# Altium schematic symbol library 13-Analog D 数模模数.SchLib: 573 symbols (part 1 of 6)
Pins are listed as number, name and electrical type; pins without a type are passive.

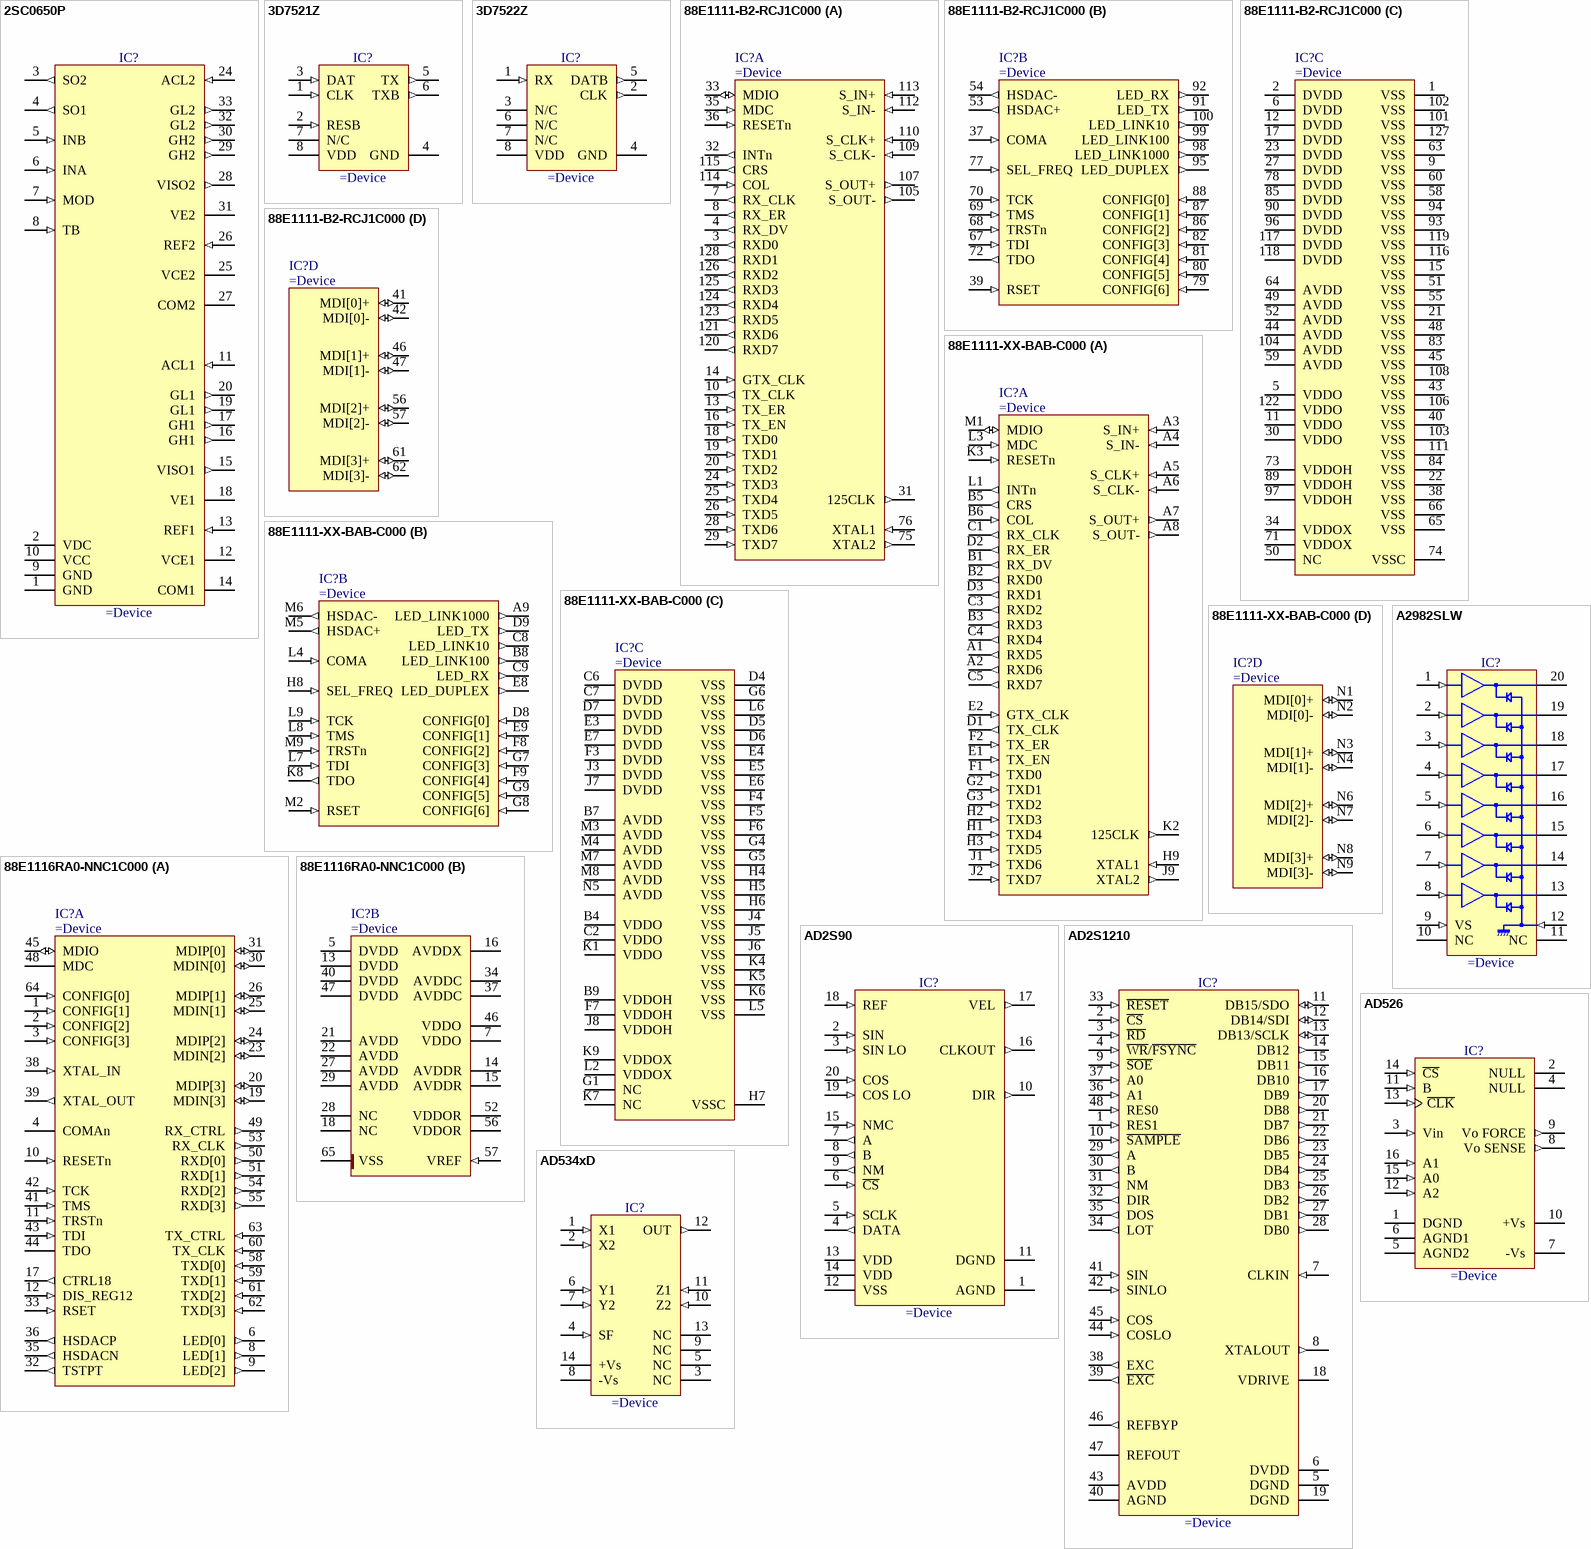
[diagram p0: symbols 2SC0650P to AD534xD]

## 2SC0650P
designator IC?
Dual-Channel High-Power High-Frequency SCALE-2 Driver Core
pins: 1 GND (power), 2 VDC (power), 3 SO2 (out), 4 SO1 (out), 5 INB (in), 6 INA (in), 7 MOD (in), 8 TB (in), 9 GND (power), 10 VCC (power), 11 ACL1 (in), 12 VCE1 (oc), 13 REF1 (in), 14 COM1 (power), 15 VISO1 (out), 16 GH1 (out), 17 GH1 (out), 18 VE1 (oe), 19 GL1 (out), 20 GL1 (out), 24 ACL2 (in), 25 VCE2 (oc), 26 REF2 (in), 27 COM2 (power), 28 VISO2 (out), 29 GH2 (out), 30 GH2 (out), 31 VE2 (oe), 32 GL2 (out), 33 GL2 (out)

## 3D7521Z
designator IC?
Monolithic Manchester Encoder
pins: 1 CLK (in), 2 RESB (in), 3 DAT (in), 4 GND (power), 5 TX (out), 6 TXB (out), 7 N/C, 8 VDD (power)

## 3D7522Z
designator IC?
Monolithic CMOS Manchester Decoders
pins: 1 RX (in), 2 CLK (out), 3 N/C, 4 GND (power), 5 DATB (out), 6 N/C, 7 N/C, 8 VDD (power)

## 88E1111-B2-RCJ1C000
designator IC?
Integrated 10/100/1000 Ultra Gigabit Ethernet Transceiver
part A pins: 3 RXD0 (out), 4 RX_DV (out), 7 RX_CLK (out), 8 RX_ER (out), 10 TX_CLK (out), 13 TX_ER (in), 14 GTX_CLK (in), 16 TX_EN (in), 18 TXD0 (in), 19 TXD1 (in), 20 TXD2 (in), 24 TXD3 (in), 25 TXD4 (in), 26 TXD5 (in), 28 TXD6 (in), 29 TXD7 (in), 31 125CLK (out), 32 INTn (out), 33 MDIO (io), 35 MDC (in), 36 RESETn (in), 75 XTAL2 (out), 76 XTAL1 (in), 105 S_OUT- (out), 107 S_OUT+ (out), 109 S_CLK- (in), 110 S_CLK+ (in), 112 S_IN- (in), 113 S_IN+ (in), 114 COL (in), 115 CRS (out), 120 RXD7 (out), 121 RXD6 (out), 123 RXD5 (out), 124 RXD4 (out), 125 RXD3 (out), 126 RXD2 (out), 128 RXD1 (out)
part B pins: 37 COMA (in), 39 RSET (in), 53 HSDAC+ (out), 54 HSDAC- (out), 67 TDI (in), 68 TRSTn (in), 69 TMS (in), 70 TCK (in), 72 TDO (out), 77 SEL_FREQ (in), 79 CONFIG[6] (in), 80 CONFIG[5] (in), 81 CONFIG[4] (in), 82 CONFIG[3] (in), 86 CONFIG[2] (in), 87 CONFIG[1] (in), 88 CONFIG[0] (in), 91 LED_TX (out), 92 LED_RX (out), 95 LED_DUPLEX (out), 98 LED_LINK1000 (out), 99 LED_LINK100 (out), 100 LED_LINK10 (out)
part C pins: 1 VSS (power), 2 DVDD (power), 5 VDDO (power), 6 DVDD (power), 9 VSS (power), 11 VDDO (power), 12 DVDD (power), 15 VSS (power), 17 DVDD (power), 21 VSS (power), 22 VSS (power), 23 DVDD (power), 27 DVDD (power), 30 VDDO (power), 34 VDDOX (power), 38 VSS (power), 40 VSS (power), 43 VSS (power), 44 AVDD (power), 45 VSS (power), 48 VSS (power), 49 AVDD (power), 50 NC, 51 VSS (power), 52 AVDD (power), 55 VSS (power), 58 VSS (power), 59 AVDD (power), 60 VSS (power), 63 VSS (power), 64 AVDD (power), 65 VSS (power), 66 VSS (power), 71 VDDOX (power), 73 VDDOH (power), 74 VSSC (power), 78 DVDD (power), 83 VSS (power), 84 VSS (power), 85 DVDD (power), 89 VDDOH (power), 90 DVDD (power), 93 VSS (power), 94 VSS (power), 96 DVDD (power), 97 VDDOH (power), 101 VSS (power), 102 VSS (power), 103 VSS (power), 104 AVDD (power), 106 VSS (power), 108 VSS (power), 111 VSS (power), 116 VSS (power), 117 DVDD (power), 118 DVDD (power), 119 VSS (power), 122 VDDO (power), 127 VSS (power)
part D pins: 41 MDI[0]+ (io), 42 MDI[0]- (io), 46 MDI[1]+ (io), 47 MDI[1]- (io), 56 MDI[2]+ (io), 57 MDI[2]- (io), 61 MDI[3]+ (io), 62 MDI[3]- (io)

## 88E1111-XX-BAB-C000
designator IC?
Integrated 10/100/1000 Ultra Gigabit Ethernet Transceiver
part A pins: A1 RXD5 (out), A2 RXD6 (out), A3 S_IN+ (in), A4 S_IN- (in), A5 S_CLK+ (in), A6 S_CLK- (in), A7 S_OUT+ (out), A8 S_OUT- (out), B1 RX_DV (out), B2 RXD0 (out), B3 RXD3 (out), B5 CRS (out), B6 COL (in), C1 RX_CLK (out), C3 RXD2 (out), C4 RXD4 (out), C5 RXD7 (out), D1 TX_CLK (out), D2 RX_ER (out), D3 RXD1 (out), E1 TX_EN (in), E2 GTX_CLK (in), F1 TXD0 (in), F2 TX_ER (in), G2 TXD1 (in), G3 TXD2 (in), H1 TXD4 (in), H2 TXD3 (in), H3 TXD5 (in), H9 XTAL1 (in), J1 TXD6 (in), J2 TXD7 (in), J9 XTAL2 (out), K2 125CLK (out), K3 RESETn (in), L1 INTn (out), L3 MDC (in), M1 MDIO (io)
part B pins: A9 LED_LINK1000 (out), B8 LED_LINK100 (out), C8 LED_LINK10 (out), C9 LED_RX (out), D8 CONFIG[0] (in), D9 LED_TX (out), E8 LED_DUPLEX (out), E9 CONFIG[1] (in), F8 CONFIG[2] (in), F9 CONFIG[4] (in), G7 CONFIG[3] (in), G8 CONFIG[6] (in), G9 CONFIG[5] (in), H8 SEL_FREQ (in), K8 TDO (out), L4 COMA (in), L7 TDI (in), L8 TMS (in), L9 TCK (in), M2 RSET (in), M5 HSDAC+ (out), M6 HSDAC- (out), M9 TRSTn (in)
part C pins: B4 VDDO (power), B7 AVDD (power), B9 VDDOH (power), C2 VDDO (power), C6 DVDD (power), C7 DVDD (power), D4 VSS (power), D5 VSS (power), D6 VSS (power), D7 DVDD (power), E3 DVDD (power), E4 VSS (power), E5 VSS (power), E6 VSS (power), E7 DVDD (power), F3 DVDD (power), F4 VSS (power), F5 VSS (power), F6 VSS (power), F7 VDDOH (power), G1 NC, G4 VSS (power), G5 VSS (power), G6 VSS (power), H4 VSS (power), H5 VSS (power), H6 VSS (power), H7 VSSC (power), J3 DVDD (power), J4 VSS (power), J5 VSS (power), J6 VSS (power), J7 DVDD (power), J8 VDDOH (power), K1 VDDO (power), K4 VSS (power), K5 VSS (power), K6 VSS (power), K7 NC, K9 VDDOX (power), L2 VDDOX (power), L5 VSS (power), L6 VSS (power), M3 AVDD (power), M4 AVDD (power), M7 AVDD (power), M8 AVDD (power), N5 AVDD (power)
part D pins: N1 MDI[0]+ (io), N2 MDI[0]- (io), N3 MDI[1]+ (io), N4 MDI[1]- (io), N6 MDI[2]+ (io), N7 MDI[2]- (io), N8 MDI[3]+ (io), N9 MDI[3]- (io)

## 88E1116RA0-NNC1C000
designator IC?
Integrated 10/100/1000 Alaska® Gigabit Ethernet Transceiver
part A pins: 1 CONFIG[1] (in), 2 CONFIG[2] (in), 3 CONFIG[3] (in), 4 COMAn (power), 6 LED[0] (out), 8 LED[1] (out), 9 LED[2] (out), 10 RESETn (in), 11 TRSTn (in), 12 DIS_REG12 (in), 17 CTRL18 (out), 19 MDIN[3] (io), 20 MDIP[3] (io), 23 MDIN[2] (io), 24 MDIP[2] (io), 25 MDIN[1] (io), 26 MDIP[1] (io), 30 MDIN[0] (io), 31 MDIP[0] (io), 32 TSTPT (out), 33 RSET (in), 35 HSDACN (out), 36 HSDACP (out), 38 XTAL_IN (in), 39 XTAL_OUT (out), 41 TMS (in), 42 TCK (in), 43 TDI (in), 44 TDO, 45 MDIO (io), 48 MDC, 49 RX_CTRL (out), 50 RXD[0] (out), 51 RXD[1] (out), 53 RX_CLK (out), 54 RXD[2] (out), 55 RXD[3] (out), 58 TXD[0] (in), 59 TXD[1] (in), 60 TX_CLK (in), 61 TXD[2] (in), 62 TXD[3] (in), 63 TX_CTRL (in), 64 CONFIG[0] (in)
part B pins: 5 DVDD (power), 7 VDDO (power), 13 DVDD (power), 14 AVDDR (power), 15 AVDDR (power), 16 AVDDX (power), 18 NC, 21 AVDD (power), 22 AVDD (power), 27 AVDD (power), 28 NC, 29 AVDD (power), 34 AVDDC (power), 37 AVDDC (power), 40 DVDD (power), 46 VDDO (power), 47 DVDD (power), 52 VDDOR (power), 56 VDDOR (power), 57 VREF (in), 65 VSS (power)

## A2982SLW
designator IC?
8-Channel Source Drivers
pins: 1 I1 (in), 2 I2 (in), 3 I3 (in), 4 I4 (in), 5 I5 (in), 6 I6 (in), 7 I7 (in), 8 I8 (in), 9 VS (in), 10 NC, 11 NC, 12 GND (in), 13 O8 (oc), 14 O7 (oc), 15 O6 (oc), 16 O5 (oc), 17 O4 (oc), 18 O3 (oc), 19 O2 (oc), 20 O1 (oc)

## AD2S90
designator IC?
Low Cost, Complete 12-Bit Resolver-to-Digital Converter
pins: 1 AGND (power), 2 SIN (in), 3 SIN LO (in), 4 DATA (out), 5 SCLK (in), 6 ~{CS} (in), 7 A (out), 8 B (out), 9 NM (out), 10 DIR (out), 11 DGND (power), 12 VSS (power), 13 VDD (power), 14 VDD (power), 15 NMC (in), 16 CLKOUT (out), 17 VEL (out), 18 REF (in), 19 COS LO (in), 20 COS (in)

## AD2S1210
designator IC?
Variable Resolution, 10-Bit to 16-Bit R/D Converter with Reference Oscillator
pins: 1 RES1 (in), 2 ~{CS} (in), 3 ~{RD} (in), 4 ~{WR}/~{FSYNC} (in), 5 DGND (power), 6 DVDD (power), 7 CLKIN (in), 8 XTALOUT (out), 9 ~{SOE} (in), 10 ~{SAMPLE} (in), 11 DB15/SDO (io), 12 DB14/SDI (io), 13 DB13/SCLK (io), 14 DB12 (out), 15 DB11 (out), 16 DB10 (out), 17 DB9 (out), 18 VDRIVE (power), 19 DGND (power), 20 DB8 (out), 21 DB7 (out), 22 DB6 (out), 23 DB5 (out), 24 DB4 (out), 25 DB3 (out), 26 DB2 (out), 27 DB1 (out), 28 DB0 (out), 29 A (out), 30 B (out), 31 NM (out), 32 DIR (out), 33 ~{RESET} (in), 34 LOT (out), 35 DOS (out), 36 A1 (in), 37 A0 (in), 38 EXC (out), 39 ~{EXC} (out), 40 AGND (power), 41 SIN (in), 42 SINLO (in), 43 AVDD (power), 44 COSLO (in), 45 COS (in), 46 REFBYP (out), 47 REFOUT, 48 RES0 (in)

## AD526
designator IC?
Software Programmable Gain Amplifier
pins: 1 DGND (power), 2 NULL, 3 Vin (in), 4 NULL, 5 AGND2 (power), 6 AGND1 (power), 7 -Vs (power), 8 Vo SENSE (out), 9 Vo FORCE (out), 10 +Vs (power), 11 B (in), 12 A2 (in), 13 ~{CLK} (in), 14 ~{CS} (in), 15 A0 (in), 16 A1 (in)

## AD534xD
designator IC?
Monolithic Laser Trimmed Four-Quadrant Multiplier Divider
pins: 1 X1 (in), 2 X2 (in), 3 NC, 4 SF (in), 5 NC, 6 Y1 (in), 7 Y2 (in), 8 -Vs (power), 9 NC, 10 Z2 (in), 11 Z1 (in), 12 OUT (out), 13 NC, 14 +Vs (power)

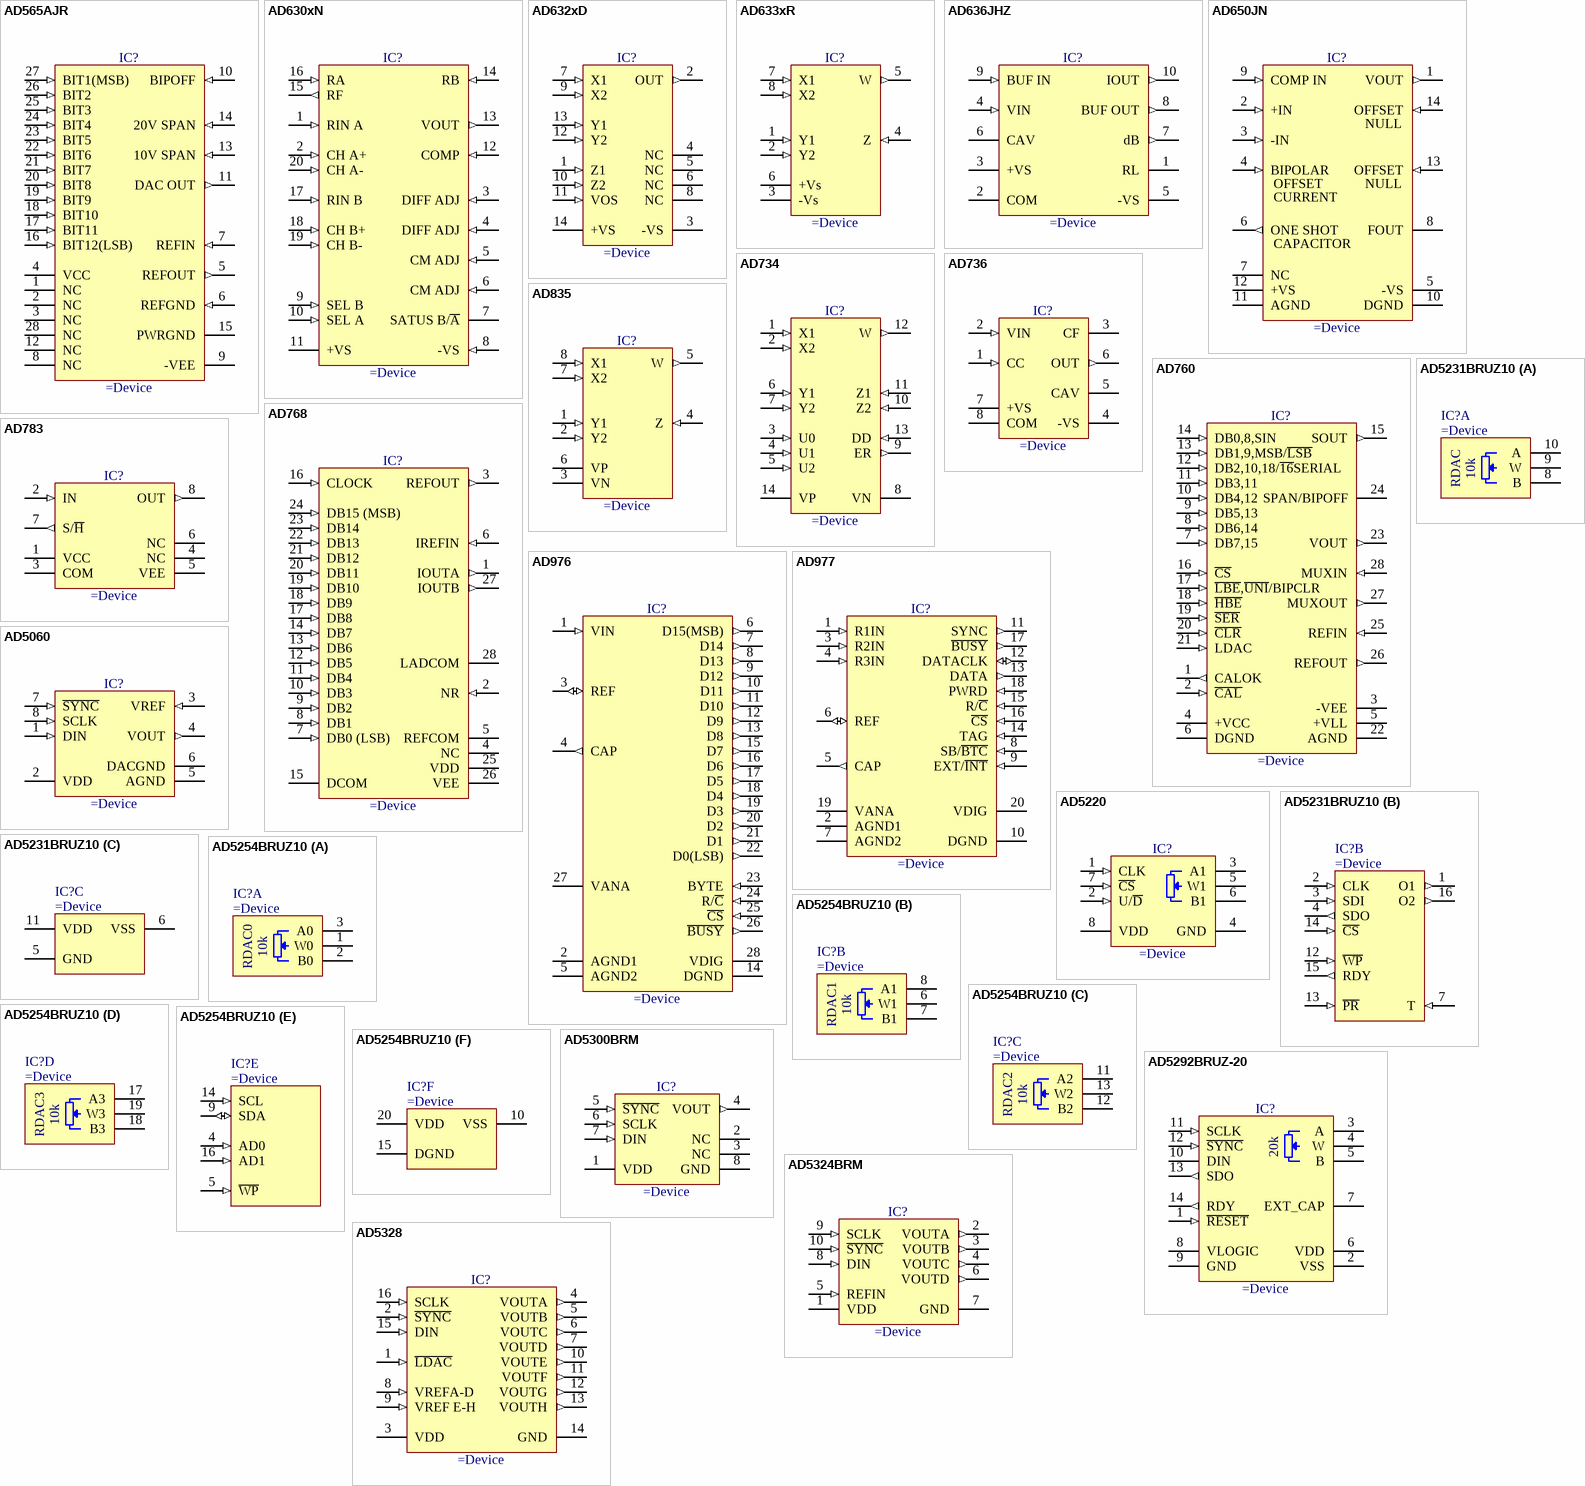
[diagram p1: symbols AD565AJR to AD5328]

## AD565AJR
designator IC?
High Speed 12-Bit Monolithic DAC
pins: 1 NC, 2 NC, 3 NC, 4 VCC (power), 5 REFOUT (out), 6 REFGND (in), 7 REFIN (in), 8 NC, 9 -VEE (power), 10 BIPOFF (in), 11 DAC OUT (out), 12 NC, 13 10V SPAN (in), 14 20V SPAN (in), 15 PWRGND (power), 16 BIT12(LSB) (in), 17 BIT11 (in), 18 BIT10 (in), 19 BIT9 (in), 20 BIT8 (in), 21 BIT7 (in), 22 BIT6 (in), 23 BIT5 (in), 24 BIT4 (in), 25 BIT3 (in), 26 BIT2 (in), 27 BIT1(MSB) (in), 28 NC

## AD630xN
designator IC?
Balanced Modulator/Demodulator
pins: 1 RIN A (in), 2 CH A+ (in), 3 DIFF ADJ (in), 4 DIFF ADJ (in), 5 CM ADJ (in), 6 CM ADJ (in), 7 SATUS B/~{A} (oc), 8 -VS (in), 9 SEL B (in), 10 SEL A (in), 11 +VS (power), 12 COMP (in), 13 VOUT (out), 14 RB (in), 15 RF (out), 16 RA (in), 17 RIN B (in), 18 CH B+ (in), 19 CH B- (in), 20 CH A- (in)

## AD632xD
designator IC?
Internally Trimmed Precision IC Multiplier
pins: 1 Z1 (in), 2 OUT (out), 3 -VS (power), 4 NC, 5 NC, 6 NC, 7 X1 (in), 8 NC, 9 X2 (in), 10 Z2 (in), 11 VOS (in), 12 Y2 (in), 13 Y1 (in), 14 +VS (power)

## AD633xR
designator IC?
Low Cost Analog Multiplier
pins: 1 Y1 (in), 2 Y2 (in), 3 -Vs (power), 4 Z (in), 5 W (out), 6 +Vs (power), 7 X1 (in), 8 X2 (in)

## AD636JHZ
designator IC?
Low Level, True RMS-to-DC Converter
pins: 1 RL, 2 COM (power), 3 +VS (power), 4 VIN (in), 5 -VS (power), 6 CAV, 7 dB (out), 8 BUF OUT (out), 9 BUF IN (in), 10 IOUT (out)

## AD650JN
designator IC?
Voltage-to-Frequency and Frequency-to-Voltage Converter
pins: 1 VOUT (out), 2 +IN (in), 3 -IN (in), 4 BIPOLAR (in), 5 -VS (power), 6 ONE SHOT (out), 7 NC, 8 FOUT (oc), 9 COMP IN (in), 10 DGND (power), 11 AGND (power), 12 +VS (power), 13 OFFSET (in), 14 OFFSET (in)
text: NULL; CURRENT; CAPACITOR

## AD734
designator IC?
10 MHz, Four-Quadrant Multiplier/Divider
pins: 1 X1 (in), 2 X2 (in), 3 U0 (in), 4 U1 (in), 5 U2 (in), 6 Y1 (in), 7 Y2 (in), 8 VN (power), 9 ER (out), 10 Z2 (in), 11 Z1 (in), 12 W (out), 13 DD (in), 14 VP (power)

## AD736
designator IC?
Low Cost, Low Power, True RMS-to-DC Converter
pins: 1 CC (in), 2 VIN (in), 3 CF, 4 -VS (power), 5 CAV, 6 OUT (out), 7 +VS (power), 8 COM (power)

## AD760
designator IC?
16/18-Bit Self Calibrating Serial/Byte DACPORT
pins: 1 CALOK (out), 2 ~{CAL} (in), 3 -VEE (power), 4 +VCC (power), 5 +VLL (power), 6 DGND (power), 7 DB7,15 (in), 8 DB6,14 (in), 9 DB5,13 (in), 10 DB4,12 (in), 11 DB3,11 (in), 12 DB2,10,18/~{16}SERIAL (in), 13 DB1,9,MSB/~{LSB} (in), 14 DB0,8,SIN (in), 15 SOUT (out), 16 ~{CS} (in), 17 ~{LBE},~{UNI}/BIPCLR (in), 18 ~{HBE} (in), 19 ~{SER} (in), 20 ~{CLR} (in), 21 LDAC (in), 22 AGND (power), 23 VOUT (out), 24 SPAN/BIPOFF, 25 REFIN (in), 26 REFOUT (out), 27 MUXOUT (out), 28 MUXIN (in)

## AD768
designator IC?
16-Bit, 30 MSPS DAC
pins: 1 IOUTA (out), 2 NR (in), 3 REFOUT (out), 4 NC, 5 REFCOM (power), 6 IREFIN (in), 7 DB0 (LSB) (in), 8 DB1 (in), 9 DB2 (in), 10 DB3 (in), 11 DB4 (in), 12 DB5 (in), 13 DB6 (in), 14 DB7 (in), 15 DCOM, 16 CLOCK (in), 17 DB8 (in), 18 DB9 (in), 19 DB10 (in), 20 DB11 (in), 21 DB12 (in), 22 DB13 (in), 23 DB14 (in), 24 DB15 (MSB) (in), 25 VDD (power), 26 VEE (power), 27 IOUTB (out), 28 LADCOM (power)

## AD783
designator IC?
Complete Very High Speed Sample-and-Hold Amplifier
pins: 1 VCC (power), 2 IN (in), 3 COM (power), 4 NC, 5 VEE (power), 6 NC, 7 S/~{H} (out), 8 OUT (out)

## AD835
designator IC?
250 MHz, Voltage Output, 4-Quadrant Multiplier
pins: 1 Y1 (in), 2 Y2 (in), 3 VN (power), 4 Z (in), 5 W (out), 6 VP (power), 7 X2 (in), 8 X1 (in)

## AD976
designator IC?
16-Bit, 100 kSPS/200 kSPS BiCMOS Analog-To-Digital Converter
pins: 1 VIN (in), 2 AGND1 (power), 3 REF (io), 4 CAP (out), 5 AGND2 (power), 6 D15(MSB) (out), 7 D14 (out), 8 D13 (out), 9 D12 (out), 10 D11 (out), 11 D10 (out), 12 D9 (out), 13 D8 (out), 14 DGND (power), 15 D7 (out), 16 D6 (out), 17 D5 (out), 18 D4 (out), 19 D3 (out), 20 D2 (out), 21 D1 (out), 22 D0(LSB) (out), 23 BYTE (in), 24 R/~{C} (in), 25 ~{CS} (in), 26 ~{BUSY} (out), 27 VANA (power), 28 VDIG (power)

## AD977
designator IC?
16-Bit, 100 kSPS/200 kSPS BiCMOS Analog-To-Digital Converter
pins: 1 R1IN (in), 2 AGND1 (power), 3 R2IN (in), 4 R3IN (in), 5 CAP (out), 6 REF (io), 7 AGND2 (power), 8 SB/~{BTC} (in), 9 EXT/~{INT} (in), 10 DGND (power), 11 SYNC (out), 12 DATACLK (io), 13 DATA (out), 14 TAG (in), 15 R/~{C} (in), 16 ~{CS} (in), 17 ~{BUSY} (out), 18 PWRD (in), 19 VANA (power), 20 VDIG (power)

## AD5060
designator IC?
Fully Accurate 14-/16-Bit VOUT nanoDAC™ SPI Interface 2.7 V to 5.5 V
pins: 1 DIN (in), 2 VDD (power), 3 VREF (in), 4 VOUT (out), 5 AGND (power), 6 DACGND (power), 7 ~{SYNC} (in), 8 SCLK (in)

## AD5220
designator IC?
Increment/Decrement Digital Potentiometer
pins: 1 CLK (in), 2 U/~{D} (in), 3 A1, 4 GND (power), 5 W1, 6 B1, 7 ~{CS} (in), 8 VDD (power)

## AD5231BRUZ10
designator IC?
Nonvolatile Memory, 1024-Position, 10k Digital Potentiometer
part A pins: 8 B, 9 W, 10 A
part B pins: 1 O1 (out), 2 CLK (in), 3 SDI (in), 4 SDO (out), 7 T (in), 12 ~{WP} (in), 13 ~{PR} (in), 14 ~{CS} (in), 15 RDY (out), 16 O2 (out)
part C pins: 5 GND (power), 6 VSS (power), 11 VDD (power)
part A text: RDAC; 10k

## AD5254BRUZ10
designator IC?
Quad 256-Position I2C Nonvolatile Memory, 10k Digital Potentiometer
part A pins: 1 W0, 2 B0, 3 A0
part B pins: 6 W1, 7 B1, 8 A1
part C pins: 11 A2, 12 B2, 13 W2
part D pins: 17 A3, 18 B3, 19 W3
part E pins: 4 AD0 (in), 5 ~{WP} (in), 9 SDA (io), 14 SCL (in), 16 AD1 (in)
part F pins: 10 VSS (power), 15 DGND (power), 20 VDD (power)
part A text: RDAC0; 10k
part B text: RDAC1; 10k
part C text: RDAC2; 10k
part D text: RDAC3; 10k

## AD5292BRUZ-20
designator IC?
1024-Position, Digital Potentiometers with Maximum ±1% R-Tolerance Error and 20 Time Programmable Memory
pins: 1 ~{RESET} (in), 2 VSS (power), 3 A, 4 W, 5 B, 6 VDD (power), 7 EXT_CAP, 8 VLOGIC (power), 9 GND (power), 10 DIN (power), 11 SCLK (in), 12 ~{SYNC} (in), 13 SDO (out), 14 RDY (out)
text: 20k

## AD5300BRM
designator IC?
2.7 V to 5.5 V, 140 uA, Rail-to-Rail Output 8-Bit DAC
pins: 1 VDD (power), 2 NC, 3 NC, 4 VOUT (out), 5 ~{SYNC} (in), 6 SCLK (in), 7 DIN (in), 8 GND (power)

## AD5324BRM
designator IC?
2.5 V to 5.5 V, 500 µA Quad Voltage Output 12-Bit DAC
pins: 1 VDD (power), 2 VOUTA (out), 3 VOUTB (out), 4 VOUTC (out), 5 REFIN (in), 6 VOUTD (out), 7 GND (power), 8 DIN (in), 9 SCLK (in), 10 ~{SYNC} (in)

## AD5328
designator IC?
2.5 V to 5.5 V Octal Voltage Output 12-Bit DAC
pins: 1 ~{LDAC} (in), 2 ~{SYNC} (in), 3 VDD (power), 4 VOUTA (out), 5 VOUTB (out), 6 VOUTC (out), 7 VOUTD (out), 8 VREFA-D (in), 9 VREF E-H (in), 10 VOUTE (out), 11 VOUTF (out), 12 VOUTG (out), 13 VOUTH (out), 14 GND (power), 15 DIN (in), 16 SCLK (in)

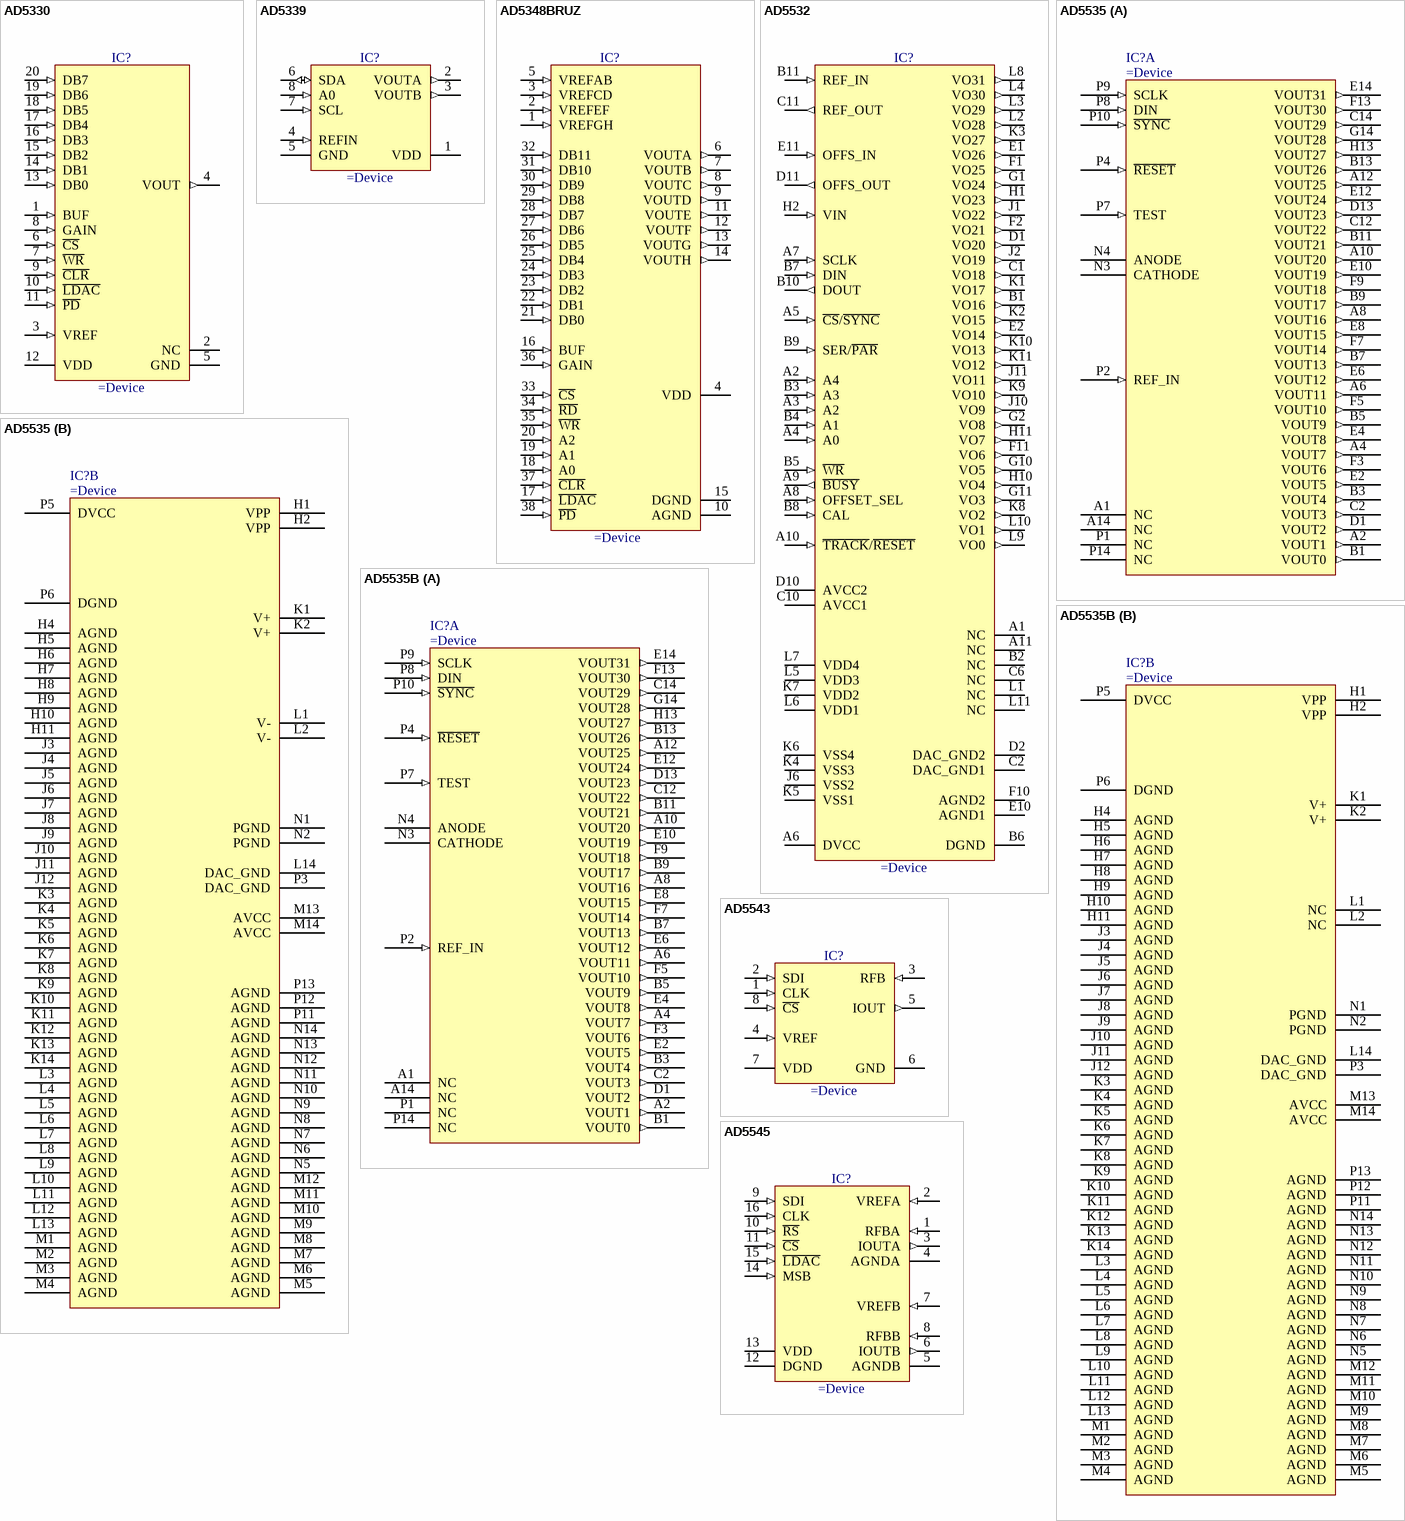
[diagram p2: symbols AD5330 to AD5545]

## AD5330
designator IC?
2.5V to 5.5V, 115µA Parallel Interface Single Voltage-Output 8-Bit DAC
pins: 1 BUF (in), 2 NC, 3 VREF (in), 4 VOUT (out), 5 GND (power), 6 ~{CS} (in), 7 ~{WR} (in), 8 GAIN (in), 9 ~{CLR} (in), 10 ~{LDAC} (in), 11 ~{PD} (in), 12 VDD (power), 13 DB0 (in), 14 DB1 (in), 15 DB2 (in), 16 DB3 (in), 17 DB4 (in), 18 DB5 (in), 19 DB6 (in), 20 DB7 (in)

## AD5339
designator IC?
2.5 V to 5.5 V, 250 μA, 2-Wire Interface, Dual Voltage Output, 12-Bit DAC
pins: 1 VDD (power), 2 VOUTA (out), 3 VOUTB (out), 4 REFIN (in), 5 GND (power), 6 SDA (io), 7 SCL (in), 8 A0 (in)

## AD5348BRUZ
designator IC?
2.5 V to 5.5 V, Parallel Interface Octal Voltage Output 12-Bit DAC
pins: 1 VREFGH (in), 2 VREFEF (in), 3 VREFCD (in), 4 VDD (power), 5 VREFAB (in), 6 VOUTA (out), 7 VOUTB (out), 8 VOUTC (out), 9 VOUTD (out), 10 AGND (power), 11 VOUTE (out), 12 VOUTF (out), 13 VOUTG (out), 14 VOUTH (out), 15 DGND (power), 16 BUF (in), 17 ~{LDAC} (in), 18 A0 (in), 19 A1 (in), 20 A2 (in), 21 DB0 (in), 22 DB1 (in), 23 DB2 (in), 24 DB3 (in), 25 DB4 (in), 26 DB5 (in), 27 DB6 (in), 28 DB7 (in), 29 DB8 (in), 30 DB9 (in), 31 DB10 (in), 32 DB11 (in), 33 ~{CS} (in), 34 ~{RD} (in), 35 ~{WR} (in), 36 GAIN (in), 37 ~{CLR} (in), 38 ~{PD} (in)

## AD5532
designator IC?
32-Channel, 14-Bit Voltage-Output DAC
pins: A1 NC, A2 A4 (in), A3 A2 (in), A4 A0 (in), A5 ~{CS}/~{SYNC} (in), A6 DVCC (power), A7 SCLK (in), A8 OFFSET_SEL (in), A9 ~{BUSY} (out), A10 ~{TRACK}/~{RESET} (in), A11 NC, B1 VO16 (out), B2 NC, B3 A3 (in), B4 A1 (in), B5 ~{WR} (in), B6 DGND (power), B7 DIN (in), B8 CAL (in), B9 SER/~{PAR} (in), B10 DOUT (out), B11 REF_IN (in), C1 VO18 (out), C2 DAC_GND1 (power), C6 NC, C10 AVCC1 (power), C11 REF_OUT (out), D1 VO20 (out), D2 DAC_GND2 (power), D10 AVCC2 (power), D11 OFFS_OUT (out), E1 VO26 (out), E2 VO14 (out), E10 AGND1 (power), E11 OFFS_IN (in), F1 VO25 (out), F2 VO21 (out), F10 AGND2 (power), F11 VO6 (out), G1 VO24 (out), G2 VO8 (out), G10 VO5 (out), G11 VO3 (out), H1 VO23 (out), H2 VIN (in), H10 VO4 (out), H11 VO7 (out), J1 VO22 (out), J2 VO19 (out), J6 VSS2 (power), J10 VO9 (out), J11 VO11 (out), K1 VO17 (out), K2 VO15 (out), K3 VO27 (out), K4 VSS3 (power), K5 VSS1 (power), K6 VSS4 (power), K7 VDD2 (power), K8 VO2 (out), K9 VO10 (out), K10 VO13 (out), K11 VO12 (out), L1 NC, L2 VO28 (out), L3 VO29 (out), L4 VO30 (out), L5 VDD3 (power), L6 VDD1 (power), L7 VDD4 (power), L8 VO31 (out), L9 VO0 (out), L10 VO1 (out), L11 NC

## AD5535
designator IC?
32-Channel, 14-Bit DAC with Full-Scale Output Voltage Programmable from 50V to 200V
part A pins: A1 NC, A2 VOUT1 (out), A4 VOUT7 (out), A6 VOUT11 (out), A8 VOUT16 (out), A10 VOUT20 (out), A12 VOUT25 (out), A14 NC, B1 VOUT0 (out), B3 VOUT4 (out), B5 VOUT9 (out), B7 VOUT13 (out), B9 VOUT17 (out), B11 VOUT21 (out), B13 VOUT26 (out), C2 VOUT3 (out), C12 VOUT22 (out), C14 VOUT29 (out), D1 VOUT2 (out), D13 VOUT23 (out), E2 VOUT5 (out), E4 VOUT8 (out), E6 VOUT12 (out), E8 VOUT15 (out), E10 VOUT19 (out), E12 VOUT24 (out), E14 VOUT31 (out), F3 VOUT6 (out), F5 VOUT10 (out), F7 VOUT14 (out), F9 VOUT18 (out), F13 VOUT30 (out), G14 VOUT28 (out), H13 VOUT27 (out), N3 CATHODE, N4 ANODE, P1 NC, P2 REF_IN (in), P4 ~{RESET} (in), P7 TEST (in), P8 DIN (in), P9 SCLK (in), P10 ~{SYNC} (in), P14 NC
part B pins: H1 VPP (power), H2 VPP (power), H4 AGND (power), H5 AGND (power), H6 AGND (power), H7 AGND (power), H8 AGND (power), H9 AGND (power), H10 AGND (power), H11 AGND (power), J3 AGND (power), J4 AGND (power), J5 AGND (power), J6 AGND (power), J7 AGND (power), J8 AGND (power), J9 AGND (power), J10 AGND (power), J11 AGND (power), J12 AGND (power), K1 V+ (power), K2 V+ (power), K3 AGND (power), K4 AGND (power), K5 AGND (power), K6 AGND (power), K7 AGND (power), K8 AGND (power), K9 AGND (power), K10 AGND (power), K11 AGND (power), K12 AGND (power), K13 AGND (power), K14 AGND (power), L1 V- (power), L2 V- (power), L3 AGND (power), L4 AGND (power), L5 AGND (power), L6 AGND (power), L7 AGND (power), L8 AGND (power), L9 AGND (power), L10 AGND (power), L11 AGND (power), L12 AGND (power), L13 AGND (power), L14 DAC_GND (power), M1 AGND (power), M2 AGND (power), M3 AGND (power), M4 AGND (power), M5 AGND (power), M6 AGND (power), M7 AGND (power), M8 AGND (power), M9 AGND (power), M10 AGND (power), M11 AGND (power), M12 AGND (power), M13 AVCC (power), M14 AVCC (power), N1 PGND (power), N2 PGND (power), N5 AGND (power), N6 AGND (power), N7 AGND (power), N8 AGND (power), N9 AGND (power), N10 AGND (power), N11 AGND (power), N12 AGND (power), N13 AGND (power), N14 AGND (power), P3 DAC_GND (power), P5 DVCC (power), P6 DGND (power), P11 AGND (power), P12 AGND (power), P13 AGND (power)

## AD5535B
designator IC?
32-Channel, 14-Bit DAC with Full-Scale Output Voltage Programmable from 50V to 200V
part A pins: A1 NC, A2 VOUT1 (out), A4 VOUT7 (out), A6 VOUT11 (out), A8 VOUT16 (out), A10 VOUT20 (out), A12 VOUT25 (out), A14 NC, B1 VOUT0 (out), B3 VOUT4 (out), B5 VOUT9 (out), B7 VOUT13 (out), B9 VOUT17 (out), B11 VOUT21 (out), B13 VOUT26 (out), C2 VOUT3 (out), C12 VOUT22 (out), C14 VOUT29 (out), D1 VOUT2 (out), D13 VOUT23 (out), E2 VOUT5 (out), E4 VOUT8 (out), E6 VOUT12 (out), E8 VOUT15 (out), E10 VOUT19 (out), E12 VOUT24 (out), E14 VOUT31 (out), F3 VOUT6 (out), F5 VOUT10 (out), F7 VOUT14 (out), F9 VOUT18 (out), F13 VOUT30 (out), G14 VOUT28 (out), H13 VOUT27 (out), N3 CATHODE, N4 ANODE, P1 NC, P2 REF_IN (in), P4 ~{RESET} (in), P7 TEST (in), P8 DIN (in), P9 SCLK (in), P10 ~{SYNC} (in), P14 NC
part B pins: H1 VPP (power), H2 VPP (power), H4 AGND (power), H5 AGND (power), H6 AGND (power), H7 AGND (power), H8 AGND (power), H9 AGND (power), H10 AGND (power), H11 AGND (power), J3 AGND (power), J4 AGND (power), J5 AGND (power), J6 AGND (power), J7 AGND (power), J8 AGND (power), J9 AGND (power), J10 AGND (power), J11 AGND (power), J12 AGND (power), K1 V+ (power), K2 V+ (power), K3 AGND (power), K4 AGND (power), K5 AGND (power), K6 AGND (power), K7 AGND (power), K8 AGND (power), K9 AGND (power), K10 AGND (power), K11 AGND (power), K12 AGND (power), K13 AGND (power), K14 AGND (power), L1 NC, L2 NC, L3 AGND (power), L4 AGND (power), L5 AGND (power), L6 AGND (power), L7 AGND (power), L8 AGND (power), L9 AGND (power), L10 AGND (power), L11 AGND (power), L12 AGND (power), L13 AGND (power), L14 DAC_GND (power), M1 AGND (power), M2 AGND (power), M3 AGND (power), M4 AGND (power), M5 AGND (power), M6 AGND (power), M7 AGND (power), M8 AGND (power), M9 AGND (power), M10 AGND (power), M11 AGND (power), M12 AGND (power), M13 AVCC (power), M14 AVCC (power), N1 PGND (power), N2 PGND (power), N5 AGND (power), N6 AGND (power), N7 AGND (power), N8 AGND (power), N9 AGND (power), N10 AGND (power), N11 AGND (power), N12 AGND (power), N13 AGND (power), N14 AGND (power), P3 DAC_GND (power), P5 DVCC (power), P6 DGND (power), P11 AGND (power), P12 AGND (power), P13 AGND (power)

## AD5543
designator IC?
Current Output/Serial Input, 16-Bit DAC
pins: 1 CLK (in), 2 SDI (in), 3 RFB (in), 4 VREF (in), 5 IOUT (out), 6 GND (power), 7 VDD (power), 8 ~{CS} (in)

## AD5545
designator IC?
Dual, Current-Output, Serial-Input, 16-Bit DAC
pins: 1 RFBA (in), 2 VREFA (in), 3 IOUTA (out), 4 AGNDA (power), 5 AGNDB (power), 6 IOUTB (out), 7 VREFB (in), 8 RFBB (in), 9 SDI (in), 10 ~{RS} (in), 11 ~{CS} (in), 12 DGND (power), 13 VDD (power), 14 MSB (in), 15 ~{LDAC} (in), 16 CLK (in)

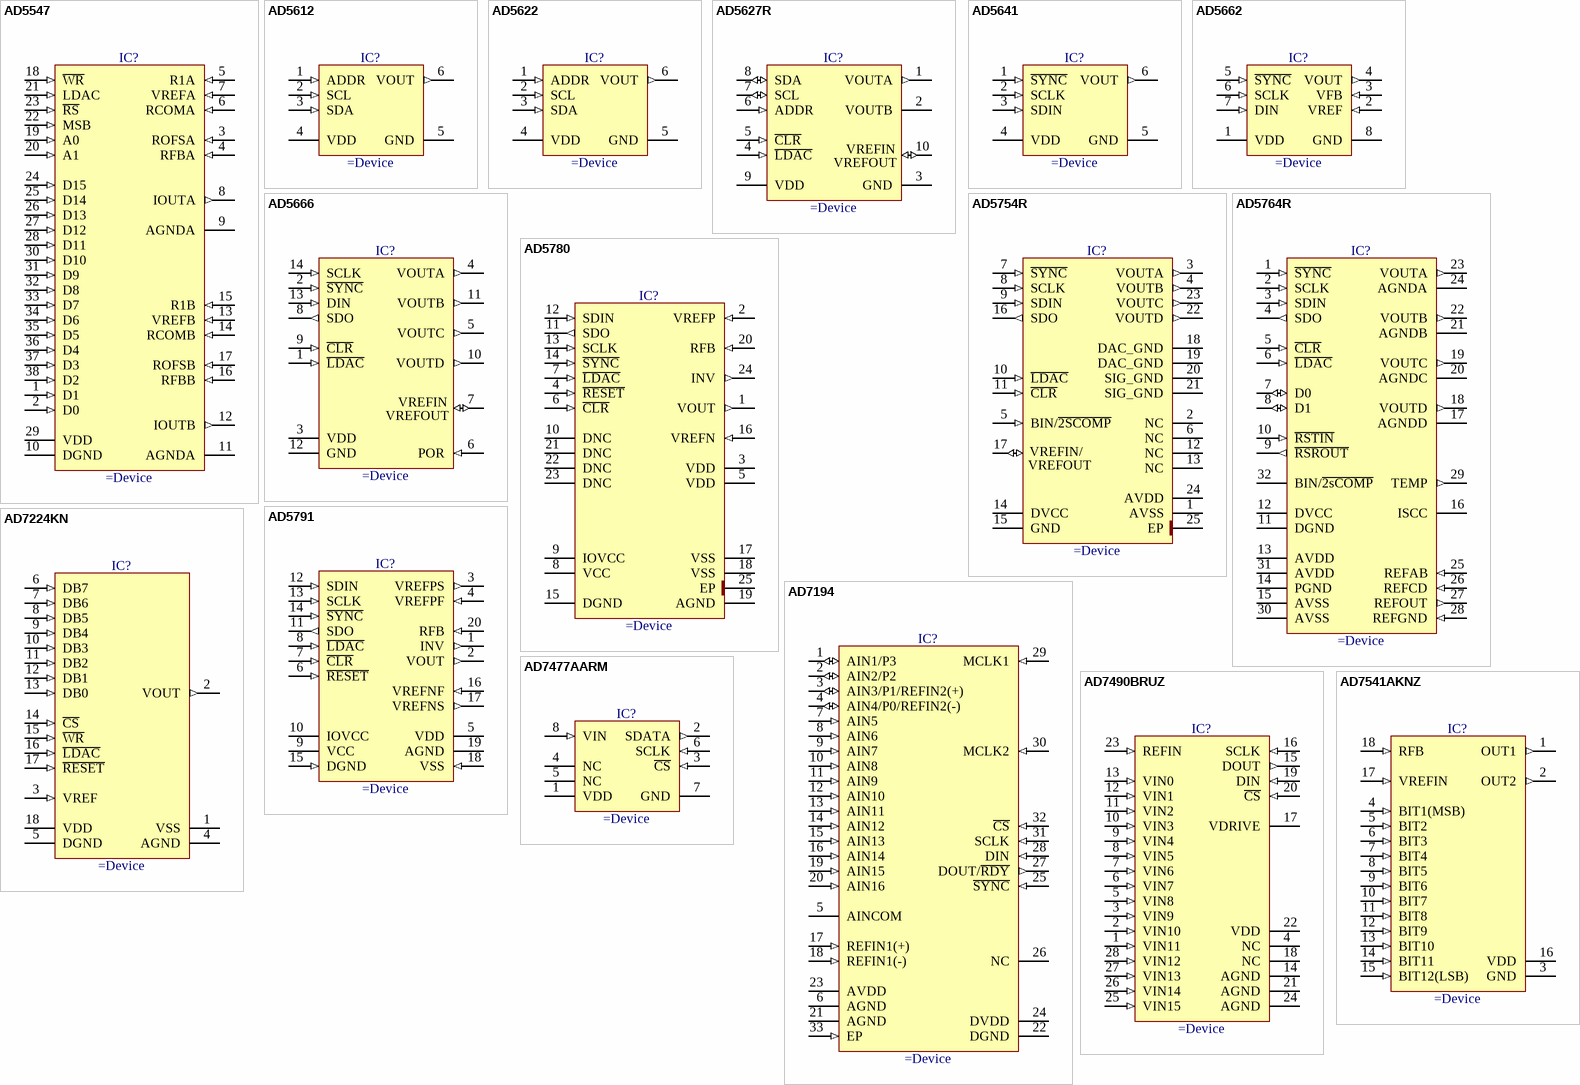
[diagram p3: symbols AD5547 to AD7541AKNZ]

## AD5547
designator IC?
Dual-Current Output, Parallel Input, 16-Bit Multiplying DAC with 4-Quadrant Resistors
pins: 1 D1 (in), 2 D0 (in), 3 ROFSA (in), 4 RFBA (in), 5 R1A (in), 6 RCOMA (in), 7 VREFA (in), 8 IOUTA (out), 9 AGNDA (power), 10 DGND (power), 11 AGNDA (power), 12 IOUTB (out), 13 VREFB (in), 14 RCOMB (in), 15 R1B (in), 16 RFBB (in), 17 ROFSB (in), 18 ~{WR} (in), 19 A0 (in), 20 A1 (in), 21 LDAC (in), 22 MSB (in), 23 ~{RS} (in), 24 D15 (in), 25 D14 (in), 26 D13 (in), 27 D12 (in), 28 D11 (in), 29 VDD (power), 30 D10 (in), 31 D9 (in), 32 D8 (in), 33 D7 (in), 34 D6 (in), 35 D5 (in), 36 D4 (in), 37 D3 (in), 38 D2 (in)

## AD5612
designator IC?
2.7 V to 5.5 V, <100 µA, 10-Bit nanoDAC, With I2C®-Compatible Interface
pins: 1 ADDR (in), 2 SCL (in), 3 SDA (in), 4 VDD (power), 5 GND (power), 6 VOUT (out)
